# Altium footprint library 电感.PcbLib: 109 footprints (part 3 of 7)
Each footprint in its own frame and in the unit in brackets; x right, y up, seen from the top. Pads: shape width x height; smd on the part's side, far side on the other; paste and mask are expansions set on the pad; w line width, h text height; cw(c..) or ccw(c..) is an arc to the next point about the centre after c.
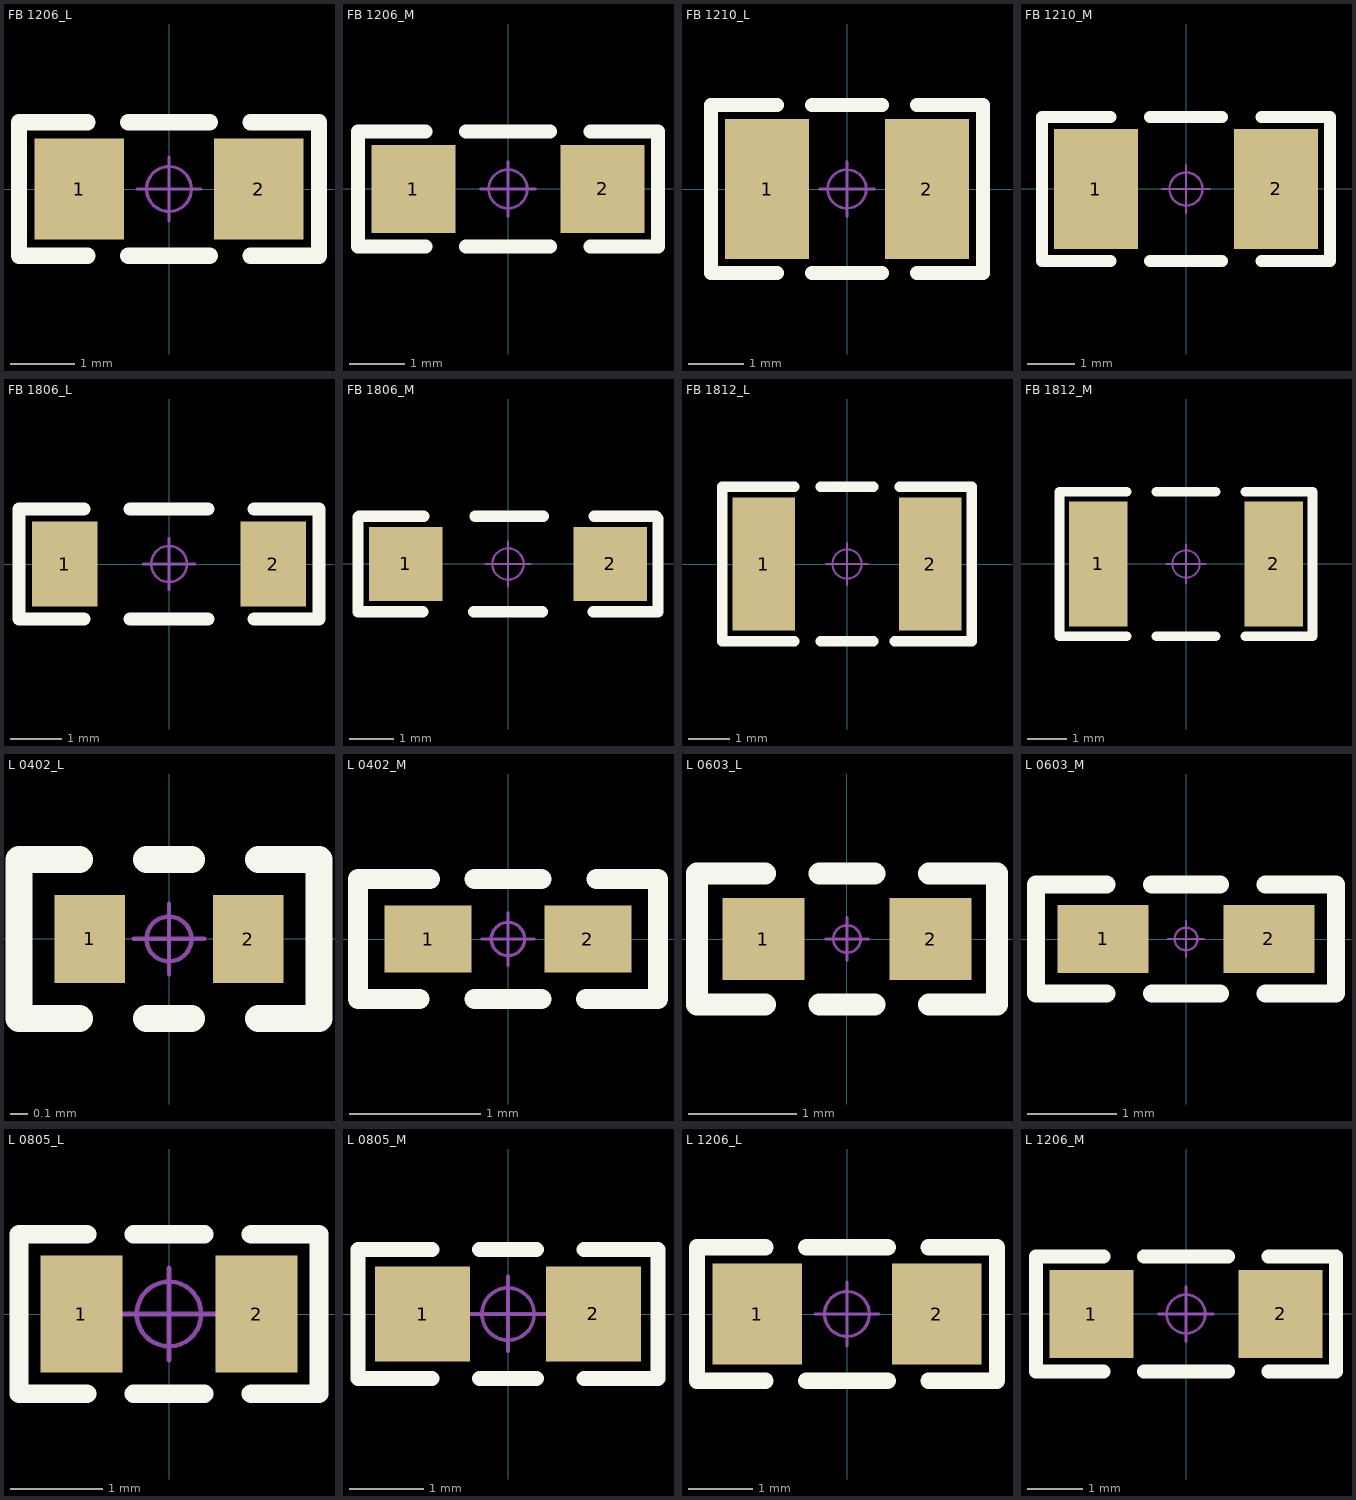
[diagram p2: the footprints below, top view; thin cyan lines are the x and y axes]

## FB 1206_L [mil] "小功率贴片磁珠"
pads (2):
  rect 55x62 smd: 1(-55.12,0) 2(55.11,0)
Top Overlay:
  lines w10: -50,-41 -92,-41 -92,41 -50,41 ; -25,-41 25,-41 ; -25,41 25,41 ; 50,-41 92,-41 92,41 50,41
Mechanical 15:
  circle w1.97: c0,0 r13.78
  lines w1.97: -19.68,0 19.68,0 ; 0,-19.68 0,19.68
3D body: height 35.43, standoff -0.12, extent -67.99,-31.49 58,31.5

## FB 1206_M [mil] "小功率贴片磁珠"
pads (2):
  rect 60x62.99 smd: 1(-67.51,-0.01) 2(67.5,0)
Top Overlay:
  lines w10: -59,-41 -107,-41 -107,41 -59,41 ; -30,-41 30,-41 ; -30,41 30,41 ; 59,-41 107,-41 107,41 59,41
Mechanical 15:
  circle w1.97: c0,0 r13.78
  lines w1.97: -19.68,0 19.68,0 ; 0,-19.68 0,19.68
3D body: height 35.43, standoff -0.12, extent -67.99,-31.49 58,31.5

## FB 1210_L [mm] "小功率贴片磁珠"
pads (2):
  rect 1.524x2.54 smd: 1(-1.45,0) 2(1.45,0)
Top Overlay:
  lines w0.254: -1.27,-1.524 -2.464,-1.524 -2.464,1.524 -1.27,1.524 ; -0.635,-1.524 0.635,-1.524 ; -0.635,1.524 0.635,1.524 ; 1.27,-1.524 2.464,-1.524 2.464,1.524 1.27,1.524
Mechanical 15:
  circle w0.05: c0,0 r0.35
  lines w0.05: -0.5,0 0.5,0 ; 0,-0.5 0,0.5
3D body: height 1.3, standoff 0, extent -1.6,-1.25 1.6,1.25

## FB 1210_M [mil] "小功率贴片磁珠"
pads (2):
  rect 70x100 smd: 1(-75,0) 2(75,0)
Top Overlay:
  lines w10: -63,-60 -120,-60 -120,60 -63,60 ; -30,-60 30,-60 ; -30,60 30,60 ; 63,-60 120,-60 120,60 63,60
Mechanical 15:
  circle w1.97: c0,0 r13.78
  lines w1.97: -19.68,0 19.68,0 ; 0,-19.68 0,19.68
3D body: height 51.18, standoff -0.12, extent -62.99,-49.21 63,49.22

## FB 1806_L [mil] "小功率贴片磁珠"
pads (2):
  rect 50x65 smd: 1(-80.01,-0.01) 2(80,0)
Top Overlay:
  lines w10: -65,-42 -115,-42 -115,42 ; -65,42 -115,42 ; -30,-42 30,-42 ; -30,42 30,42 ; 65,-42 115,-42 115,42 65,42 ; -115,42 -115,42
Mechanical 15:
  circle w1.97: c0,0 r13.78
  lines w1.97: -19.68,0 19.68,0 ; 0,-19.68 0,19.68
3D body: height 62.99, standoff -0.2, extent -88.58,-31.49 88.59,31.5

## FB 1806_M [mil] "小功率贴片磁珠"
pads (2):
  rect 65x65 smd: 1(-89.99,0) 2(90.01,0)
Top Overlay:
  lines w10: -74.99,-42 -132,-42 -132,41 -131,42 -74,42 ; -29.99,-42.01 30.01,-42.01 ; -29,42 31,42 ; 75.01,-42.01 132,-42.01 132,39.99 130,41.99 76,41.99
Mechanical 15:
  circle w1.97: c0.01,0 r13.78
  lines w1.97: -19.68,0 19.69,0 ; 0.01,-19.68 0.01,19.68
3D body: height 62.99, standoff -0.2, extent -88.57,-31.49 88.59,31.5

## FB 1812_L [mm] "小功率贴片磁珠"
pads (2):
  rect 1.5x3.2 smd: 1(-2,0) 2(2,0)
Top Overlay:
  lines w0.254: -1.27,-1.854 -2.997,-1.854 -2.997,1.854 -1.27,1.854 ; -0.635,-1.854 0.635,-1.854 ; -0.635,1.854 0.635,1.854 ; 1.143,-1.854 2.997,-1.854 2.997,1.854 1.27,1.854
Mechanical 15:
  circle w0.05: c0,0 r0.35
  lines w0.05: -0.5,0 0.5,0 ; 0,-0.5 0,0.5
3D body: height 1.5, standoff -0.01, extent -2.25,-1.6 2.25,1.6

## FB 1812_M [mm] "小功率贴片磁珠"
pads (2):
  rect 1.5x3.2 smd: 1(-2.25,0) 2(2.25,0)
Top Overlay:
  lines w0.254: -1.524,-1.854 -3.251,-1.854 -3.251,1.854 -1.524,1.854 ; -0.762,-1.854 0.762,-1.854 ; -0.762,1.854 0.762,1.854 ; 1.524,-1.854 3.251,-1.854 3.251,1.854 1.524,1.854
Mechanical 15:
  circle w0.05: c0,0 r0.35
  lines w0.05: -0.5,0 0.5,0 ; 0,-0.5 0,0.5
3D body: height 1.5, standoff -0.01, extent -2.25,-1.6 2.25,1.6

## L 0402_L [mm] "小功率贴片电感"
pads (2):
  rect 0.4x0.5 smd: 1(-0.45,0) 2(0.45,0)
Top Overlay:
  lines w0.152: -0.508,-0.45 -0.85,-0.45 -0.85,0.45 -0.508,0.45 ; -0.127,-0.45 0.127,-0.45 ; -0.127,0.45 0.127,0.45 ; 0.508,-0.45 0.85,-0.45 0.85,0.45 0.508,0.45
Mechanical 15:
  circle w0.025: c0,0 r0.127
  lines w0.025: -0.2,0 0.2,0 ; 0,-0.2 0,0.2
3D body: height 0.5, standoff 0, extent -0.5,-0.25 0.5,0.25

## L 0402_M [mil] "小功率贴片电感"
pads (2):
  rect 26x20 smd: 1(-24,0) 2(24,0)
Top Overlay:
  lines w6: -26.54,-18 -45,-18 -45,18 -23.46,18 ; -10,-18 10,-18 ; -10,18 10,18 ; 23.46,-18 45,-18 45,18 26.54,18
Mechanical 15:
  circle w1: c0,0 r5
  lines w1: -7.87,0 7.87,0 ; 0,-7.87 0,7.87
3D body: height 19.68, standoff -0.11, extent -19.69,-9.84 19.69,9.84

## L 0603_L [mil] "小功率贴片电感"
pads (2):
  rect 30x30 smd: 1(-30.59,0) 2(30.59,0)
Top Overlay:
  lines w8: -30,-24 -54.82,-24 -54.82,24 -30,24 ; -10,-24 10,-24 ; -10,24 10,24 ; 30,-24 54.83,-24 54.83,24 30,24
Mechanical 15:
  circle w1: c0,0 r5
  lines w1: -7.87,0 7.88,0 ; 0,-7.87 0,7.88
3D body: height 31.5, standoff -0.11, extent -31.49,-15.74 31.5,15.75

## L 0603_M [mil] "小功率贴片电感"
pads (2):
  rect 40x30 smd: 1(-36.5,0) 2(36.5,0)
Top Overlay:
  lines w8: -35,-24 -66,-24 -66,24 -35,24 ; -15,-24 15,-24 ; -15,24 15,24 ; 35,-24 66,-24 66,24 35,24
Mechanical 15:
  circle w1: c0,0 r5
  lines w1: -7.87,0 7.88,0 ; 0,-7.87 0,7.88
3D body: height 31.5, standoff -0.11, extent -31.49,-15.74 31.5,15.75

## L 0805_L [mil] "小功率贴片电感"
height 19.68
pads (2):
  rect 35x50 smd: 1(-37.4,0) 2(37.4,0)
Top Overlay:
  lines w8: -35,-34 -64,-34 -64,34 -35,34 ; -15,-34 15,-34 ; -15,34 15,34 ; 35,-34 64,-34 64,34 35,34
Mechanical 15:
  circle w1.97: c0,0 r13.78
  circle w1.97: c0,0 r13.78
  lines w1.97: -19.68,0 19.68,0 -19.68,0 ; 0,-19.68 0,19.68 0,-19.68
3D body: height 35.43, standoff -0.11, extent -39.37,-23.62 39.37,23.62

## L 0805_M [mm] "小功率贴片电感"
height 0.5
pads (2):
  rect 1.27x1.27 smd: 1(-1.143,0) 2(1.143,0)
Top Overlay:
  lines w0.203: -1.016,-0.864 -2.007,-0.864 -2.007,0.864 -1.016,0.864 ; -0.381,-0.864 0.381,-0.864 ; -0.381,0.864 0.381,0.864 ; 1.016,-0.864 2.007,-0.864 2.007,0.864 1.016,0.864
Mechanical 15:
  circle w0.05: c0,0 r0.35
  lines w0.05: -0.5,0 0.5,0 ; 0,-0.5 0,0.5
3D body: height 0.9, standoff 0, extent -1,-0.6 1,0.6

## L 1206_L [mil] "小功率贴片电感"
pads (2):
  rect 55x62 smd: 1(-55.12,0) 2(55.11,0)
Top Overlay:
  lines w10: -50,-41 -92,-41 -92,41 -50,41 ; -25,-41 25,-41 ; -25,41 25,41 ; 50,-41 92,-41 92,41 50,41
Mechanical 15:
  circle w1.97: c0,0 r13.78
  lines w1.97: -19.68,0 19.68,0 ; 0,-19.68 0,19.68
3D body: height 35.43, standoff -0.19, extent -67.99,-31.5 57.99,31.5

## L 1206_M [mil] "小功率贴片电感"
pads (2):
  rect 60x62.99 smd: 1(-67.51,-0.01) 2(67.5,0)
Top Overlay:
  lines w10: -59,-41 -107,-41 -107,41 -59,41 ; -30,-41 30,-41 ; -30,41 30,41 ; 59,-41 107,-41 107,41 59,41
Mechanical 15:
  circle w1.97: c0,0 r13.78
  lines w1.97: -19.68,0 19.68,0 ; 0,-19.68 0,19.68
3D body: height 35.43, standoff -0.19, extent -67.99,-31.5 57.99,31.5